# Altium footprint library 我的元件库01.PcbLib: 321 footprints (part 3 of 21)
Each footprint in its own frame and in the unit in brackets; x right, y up, seen from the top. Pads: shape width x height; smd on the part's side, far side on the other; paste and mask are expansions set on the pad; w line width, h text height; cw(c..) or ccw(c..) is an arc to the next point about the centre after c.
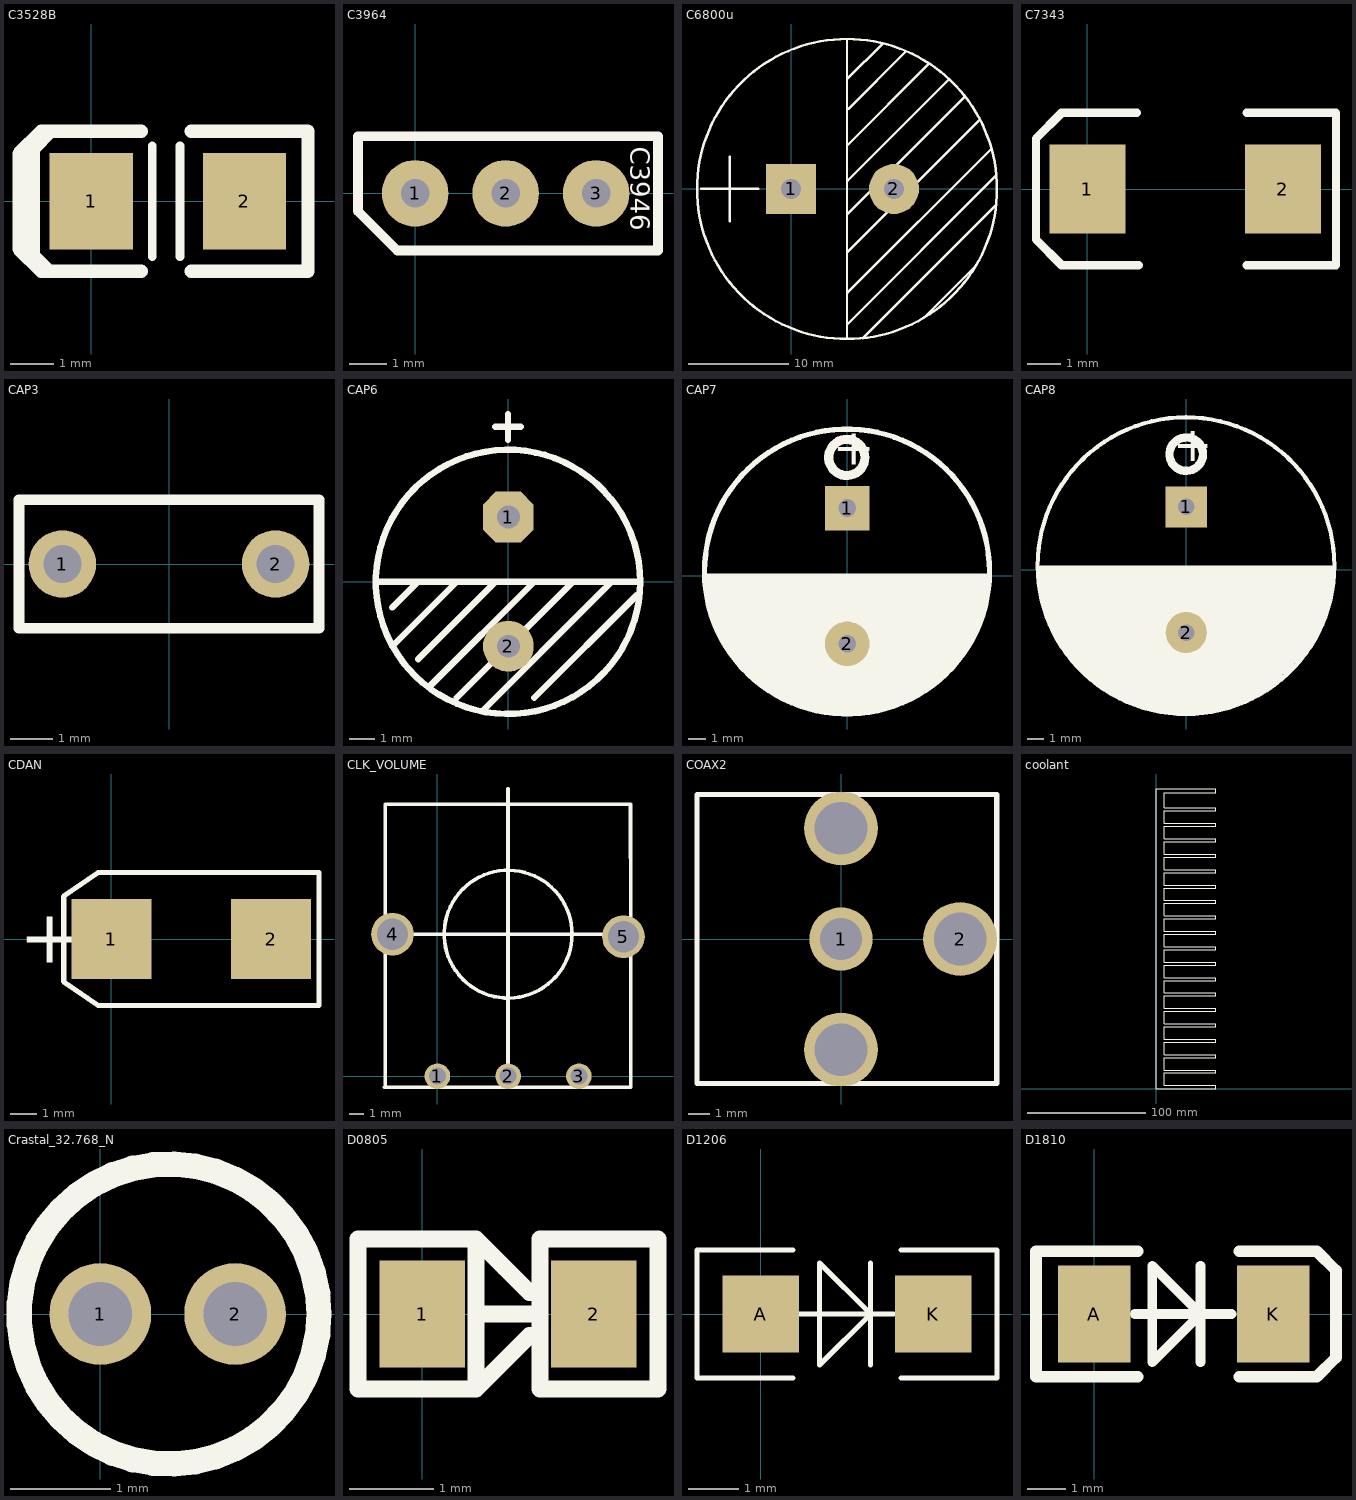
[diagram p2: the footprints below, top view; thin cyan lines are the x and y axes]

## C3528B [mm]
pads (2):
  rect 1.9x2.2 smd: 1(0,0) 2(3.5,0)
Top Overlay:
  lines w0.2: -1.417,-1.25 -1.417,1.326 ; -1.27,-1.397 -1.27,1.179 -0.889,1.56 ; -1.27,-1.143 -1.27,-1.219 -0.889,-1.6 ; 1.397,-1.27 1.397,1.27 ; 2.032,-1.27 2.032,1.27
  lines w0.3: -1.651,-1.092 -1.651,1.092 ; 4.953,-1.6 4.953,1.6
  lines w0.305: -1.651,-1.092 -1.143,-1.6 1.143,-1.6 ; -1.651,1.092 -1.143,1.6 1.143,1.6 ; 2.286,-1.6 4.953,-1.6 ; 2.286,1.6 4.953,1.6
3D body "TAJ-B.STEP": height 1.9, standoff 0, extent 0.025,-1.397 3.525,1.403

## C3964 [mil]
pads (3):
  round 70 hole 30: 1(0,0) 2(95,0) 3(190,0)
Top Overlay:
  lines w10: -60,-18.84 -18.84,-60 255,-60 255,60 -60,60 -60,-18.84
  text "C3946" at 226.59,49.16 h20
Bottom Overlay:
  lines w10: -60,-18.68 -60,60.16 255,60.16 255,-59.84 -18.84,-59.84 -60,-18.68

## C6800u [mm]
pads (2):
  rect 5x5 hole 2: 1(0,0)
  round 5 hole 2: 2(10.287,0)
Top Overlay:
  circle w0.25: c5.588,0 r15
  lines w0.1: 5.588,-10.407 5.595,-10.407 ; 5.588,-6.343 5.595,-6.343 ; 5.588,7.62 5.588,7.874 ; 5.588,7.881 5.725,8.018 ; 15.798,10.972 15.798,10.972
  lines w0.25: -8.986,0 -3.271,0 ; -6.129,-3.238 -6.129,3.238 ; 5.588,-15.005 5.588,14.967 ; 5.588,-13.582 20.498,1.328 ; 5.588,-2.533 17.377,9.255 ; 5.588,4.325 13.792,12.529 ; 5.588,10.98 9.169,14.561 ; 5.595,-10.407 20.022,4.02 ; 5.595,-6.343 18.874,6.936 ; 5.595,0.769 15.798,10.972 ; 5.725,8.018 11.481,13.774 ; 7.179,-14.919 20.49,-1.608 ; 13.317,-12.845 18.437,-7.725

## C7343 [mm]
pads (2):
  rect 2.286x2.7 smd: 1(0,0) 2(5.9,0)
Top Overlay:
  lines w0.254: 1.497,2.3 -0.789,2.3 -0.789,2.286 -1.551,1.524 -1.551,-1.524 -0.789,-2.286 -0.789,-2.3 1.548,-2.3 ; 4.799,-2.3 7.466,-2.3 ; 4.799,2.3 7.466,2.3 ; 7.5,-2.3 7.5,2.3
3D body "User Library-CAP_TANT_7343-31.step": height 3.1, standoff 0, extent -0.855,-2.325 6.745,2.275

## CAP3 [mil]
pads (2):
  round 62 hole 35: 1(-97.92,0) 2(97.92,0)
Top Overlay:
  lines w10: -137.8,-59.06 -137.8,59.06 137.8,59.06 137.8,-59.06 -137.8,-59.06
3D body "User Library-WIMA Capacitor.STEP": height 59.06, standoff -295.28, extent -141.73,-50 141.73,48.43

## CAP6 [mm]
pads (2):
  oct 2x2 hole 0.9: 1(0,2.54)
  round 2 hole 0.9: 2(0,-2.54)
Top Overlay:
  circle w0.254: c-0.013,-0.006 r5.2
  lines w0.254: -5.197,-0.006 5.072,-0.006 ; -5.082,-0.006 -5.075,-0.006 ; -4.567,-2.539 -2.027,0.001 ; -4.567,-1.015 -3.558,-0.006 ; -3.551,-3.047 -0.503,0.001 ; -3.05,-0.006 -3.043,-0.006 ; -3.043,-4.063 1.021,0.001 ; -2.027,-4.571 2.545,0.001 ; -1.011,-5.079 3.561,-0.507 4.069,0.001 ; -0.521,6.09 0.495,6.09 ; -0.013,5.582 -0.013,6.598 ; 1.021,-4.571 5.085,-0.507
3D body "User Library-Panasonic_EEUFK1Cxxx.STEP": height 26.86, standoff -16, extent -5.03,-5.009 4.978,5.009

## CAP7 [mm]
pads (2):
  rect 2.5x2.5 hole 1: 1(0,3.81)
  round 2.5 hole 1: 2(0,-3.81)
Top Overlay:
  circle w0.3: c-0.013,0.248 r8
  circle w0.508: c-0.025,6.655 r1.016
  lines w0.254: -8.001,0 7.925,0
  lines w0.5: -7.823,-0.787 7.798,-0.787 ; -7.798,-0.33 7.823,-0.33 ; -7.747,-1.168 7.696,-1.168 ; -7.671,-1.626 7.62,-1.626 ; -7.569,-2.032 7.493,-2.032 ; -7.417,-2.464 7.366,-2.464 ; -7.29,-2.743 7.264,-2.743 ; -7.137,-3.099 7.061,-3.099 ; -6.858,-3.454 6.883,-3.454 ; -6.604,-3.861 6.68,-3.861 ; -6.426,-4.191 6.477,-4.191 ; -6.198,-4.547 6.248,-4.547 ; -6.045,-4.801 5.994,-4.801 ; -5.664,-5.232 5.639,-5.232 ; -5.156,-5.563 5.334,-5.563 ; -4.877,-5.842 5.004,-5.842 ; -4.496,-6.096 4.674,-6.096 ; -4.039,-6.426 4.267,-6.376 ; -3.556,-6.655 3.861,-6.604 ; -3.099,-6.883 3.302,-6.883 ; -2.565,-7.137 2.591,-7.137 ; -1.753,-7.391 1.956,-7.391
  text "+" at -0.813,5.537 h3.56
3D body "SW3dPS-CAPACITOR-2.STEP": height 25.7, standoff -2.8, extent -8.169,-8.026 8.331,8.483

## CAP8 [mm]
pads (2):
  rect 2.5x2.5 hole 1: 1(0,3.81)
  round 2.5 hole 1: 2(0,-3.81)
Top Overlay:
  circle w0.508: c0,7.01 r1.016
  circle w0.254: c-0.013,0.248 r9
  lines w0.5: -8.8,0 8.8,0 ; -8.775,-0.991 8.7,-0.991 ; -8.698,-1.397 8.6,-1.397 ; -8.648,-1.753 8.6,-1.753 ; -8.521,-2.159 8.5,-2.159 ; -8.368,-2.515 8.357,-2.515 ; -8.216,-2.896 8.255,-2.896 ; -8.103,-3.251 8.077,-3.251 ; -7.886,-3.632 7.925,-3.632 ; -7.759,-4.039 7.671,-4.039 ; -7.505,-4.42 7.391,-4.42 ; -7.301,-4.75 7.264,-4.75 ; -6.971,-5.055 7.01,-5.055 ; -6.768,-5.41 6.731,-5.41 ; -6.438,-5.766 6.35,-5.766 ; -6.158,-6.096 6.096,-6.096 ; -5.777,-6.502 5.664,-6.502 ; -5.295,-6.858 5.283,-6.858 ; -4.787,-7.188 4.851,-7.188 ; -4.253,-7.493 4.343,-7.493 ; -3.644,-7.849 3.632,-7.849 ; -2.907,-8.103 2.946,-8.103 ; -1.917,-8.382 2.007,-8.382
  lines w1: -8.509,-0.483 8.491,-0.483
  text "+" at -0.787,5.893 h3.56
3D body "User Library-Capacitor Radial Electrolitic.STEP": height 40.01, standoff -2.7, extent -8.966,-8.763 9.034,9.17

## CDAN [mm]
pads (2):
  rect 3x3 smd: 1(0,0) 2(6,0)
Top Overlay:
  lines w0.2: -1.8,-1.6 -0.5,-2.5 7.8,-2.5 7.8,2.5 -0.5,2.5 -1.8,1.6 -1.8,0 -1.8,-1.6
  text "+" at -3.477,-0.889 h2
3D body "TAJ-D.STEP": height 2.9, standoff 0, extent -0.635,-2.134 6.665,2.166

## CLK_VOLUME [mm]
pads (5):
  round 1.8 hole 1.2: 1(0,0) 2(4.98,0) 3(9.96,0)
  round 3 hole 2.2: 4(-3.159,10) 5(13.097,9.824)
Top Overlay:
  circle w0.254: c4.976,10 r4.5
  lines w0.254: -3.756,-0.763 13.516,-0.763 ; -3.679,19.142 -3.667,-0.769 ; -3.672,19.144 13.6,19.144 ; -3.159,10 13.104,10 ; 4.969,0.924 4.969,20.221 ; 13.593,19.142 13.605,11.524 13.619,-0.769
3D body "SW3dPS-Encoder.STEP": height 32, standoff -3, extent -4.047,-1.727 13.953,19.273

## COAX2 [mm]
pads (4):
  round 3 hole 2: 1(0,0)
  round 3.5 hole 2.5: 2(5.65,0) ""(0,-5.25) ""(0,5.25)
Top Overlay:
  lines w0.254: -6.833,-6.858 -6.833,6.858 7.391,6.858 7.391,-6.858 -6.833,-6.858

## coolant [mm]
Top Overlay:
  lines w0.254: 6.5,26.5 50,26.5 50,29 6.5,29 6.5,39.5 50,39.5 50,42 6.5,42 6.5,52.396 6.604,52.5 50,52.5 50,55 6.5,55 6.5,65.5 50,65.5 50,68 6.5,68 6.5,78.5 50,78.5 ; 6.5,208.548 50,208.548 ; 6.5,211.048 50,211.048 ; 6.5,221.444 6.5,211 50,211 50,208.5 6.5,208.5 6.5,198 50,198 50,195.5 6.5,195.5 6.5,185 50,185 50,182.5 6.5,182.5 6.5,172 50,172 50,169.5 6.5,169.5 6.5,159 50,159 50,156.5 6.604,156.5 6.5,156.396 6.5,146 50,146 50,143.5 6.5,143.5 6.5,133 50,133 50,130.5 6.5,130.5 ; 6.5,221.548 50,221.548 50,224.048 6.5,224.048 6.5,234.548 50,234.548 50,237.048 6.5,237.048 6.5,250 50,250 50,253 0,253 0,0 50,0 50,3 6.5,3 6.5,13.5 50,13.5 50,16 6.604,16 6.604,26.5 ; 50,78.448 50,81 6.5,81 6.5,91.5 50,91.5 50,94 6.5,94 6.5,104.5 50,104.5 50,107 ; 6.5,107 6.5,117.5 50,117.5 50,120 6.604,120 ; 6.5,107 50,107 ; 6.5,107 50,107 ; 6.5,130.5 6.5,120.104 6.604,120 ; 6.5,130.5 6.604,130.396 6.604,120

## Crastal_32.768_N [mil] "32.768k柱式晶振（未加焊）"
height 314.96
pads (2):
  round 40 hole 25: 1(0,0) 2(53,0)
Top Overlay:
  circle w10: c27,0 r59
3D body "CRYSTAL_N.stp": height 354.33, standoff -118.11, extent -32.87,-59.06 85.24,59.06

## D0805 [mil]
pads (2):
  rect 40x50 smd: 1(0,0) 2(80,0)
Top Overlay:
  lines w7.87: 25,0 50,0 ; 31.09,28.91 31.52,28.48 ; 38.07,21.93 38.19,21.81 ; 50,-10 25,-35 ; 50,10 25,35 ; 55,-10 55,5 55,0 ; 25,-35 -30,-35 -30,35 25,35 ; 25,-35 25,35 ; 55,-35 110,-35 110,35 55,35 55,-35
3D body "LED SMD0805.step": height 33.45, standoff 0.23, extent -0.2,-16.84 81,18.84

## D1206 [mil]
pads (2):
  rect 60x60 smd: A(0,0) K(135,0)
Top Overlay:
  lines w3.94: 25,-50 -50,-50 -50,50 25,50 ; 30,0 104,0 ; 86,-40 86,0 ; 86,40 86,0 ; 110,-50 185,-50 185,50 110,50 ; 86,0 46,40 46,-40 86,0
3D body "SOD-80.step": height 59.06, standoff 0, extent 1.1,-30 138.9,29.06

## D1810 [mil]
pads (2):
  rect 75x100 smd: A(0,0) K(185,0)
Top Overlay:
  lines w10: 42,0 60,0 110,0 ; 110,-50 110,50 ; 142,0 110,0 ; 110,0 60,-50 60,50 110,0
  lines w12: 45,-65 -60,-65 -60,65 45,65 ; 150,-65 230,-65 250,-45 250,45 230,65 150,65
3D body "DO-214AA.step": height 98.43, standoff 0, extent -18.24,-76 202.24,77.54